# Altium integrated library Integrated_Library - 02.02.25 - 22.49.IntLib: 792 symbols (part 8 of 11)
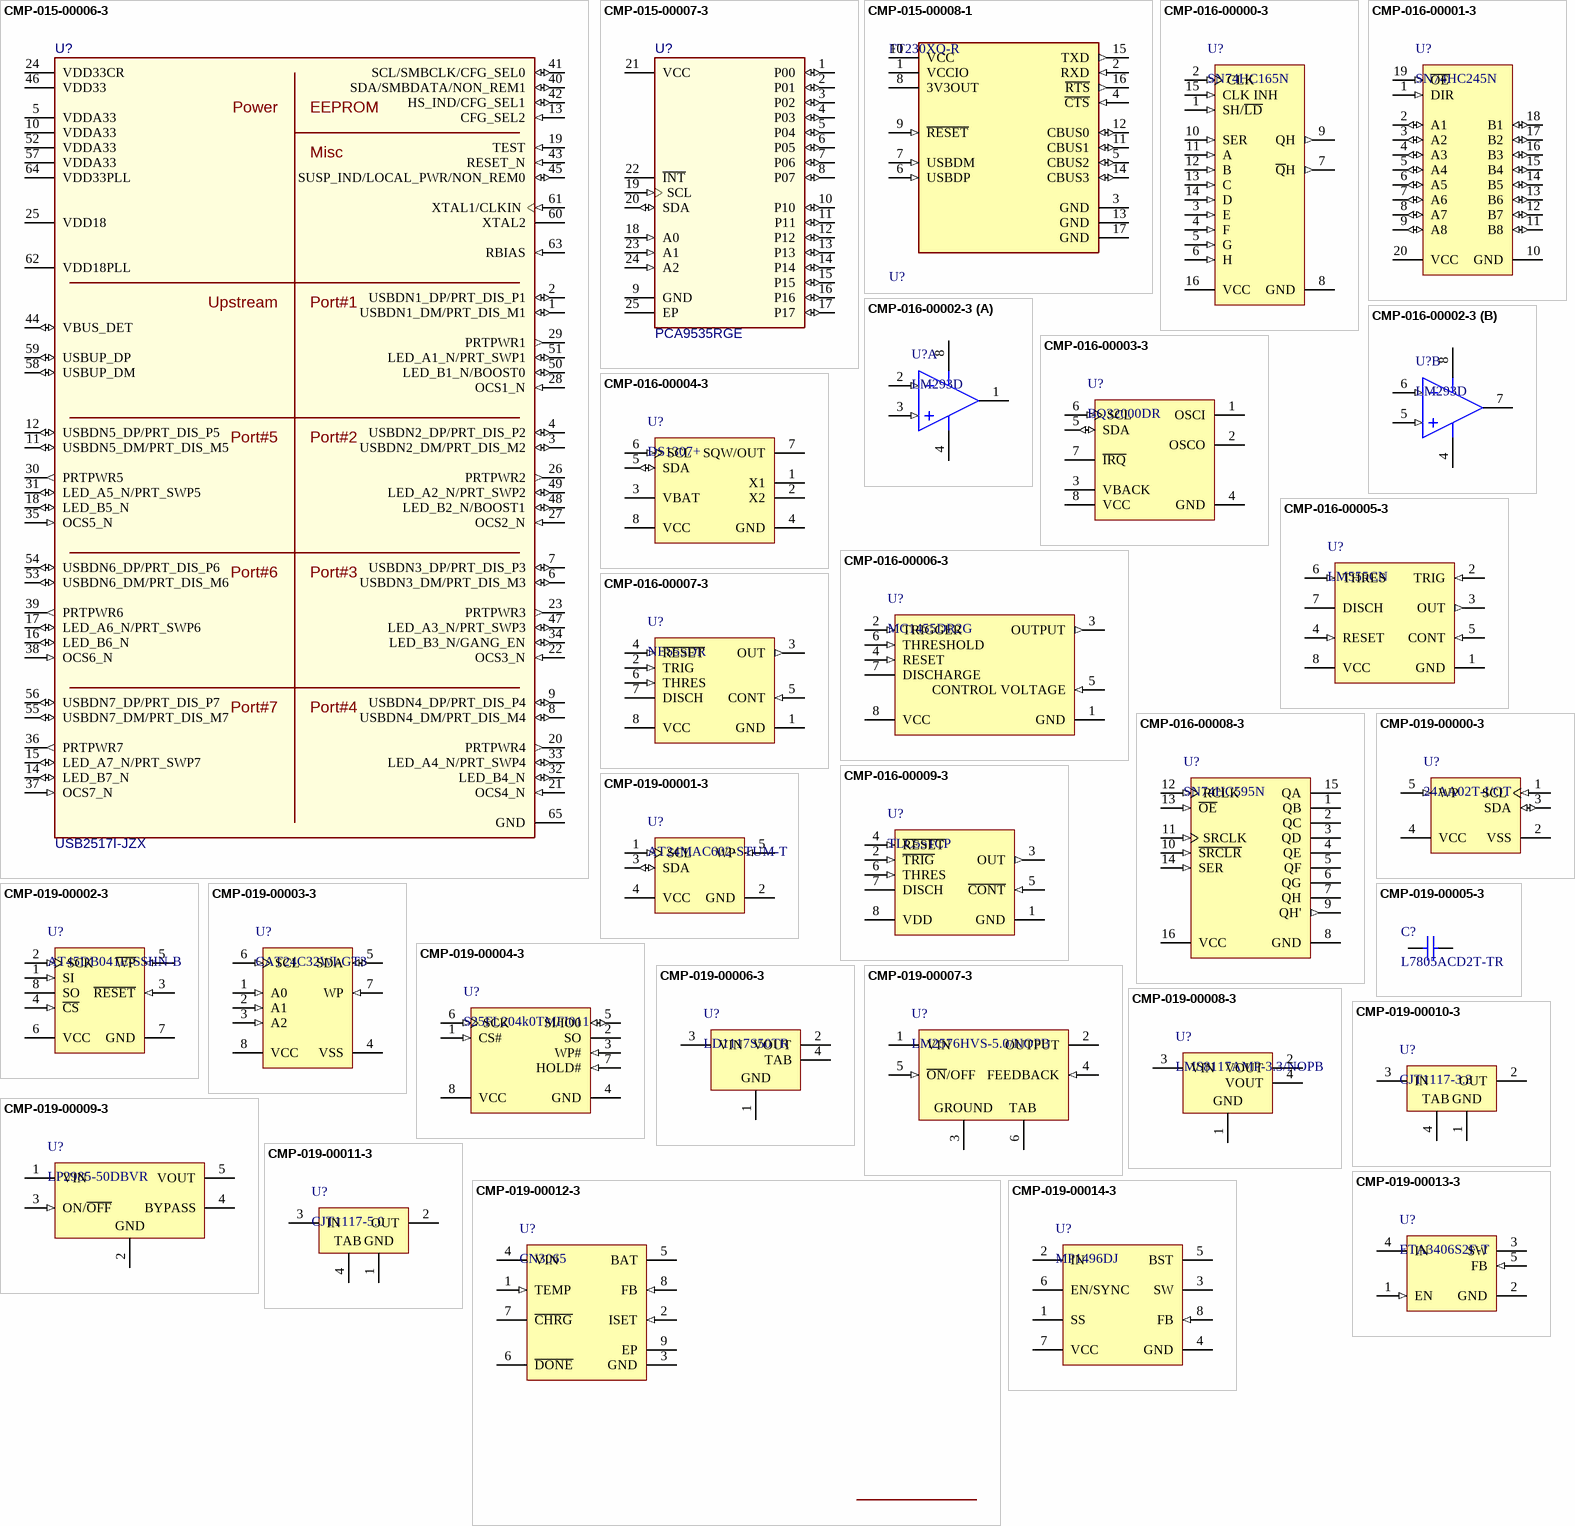
[diagram p33: symbols CMP-015-00006-3 to CMP-019-00014-3]

## CMP-015-00006-3
designator U?, comment USB2517I-JZX
Industrial Temperature Rated USB 2.0 Hi-Speed 7-Port Hub Controller, 3.3 V, -40 to 85 degC, 64-Pin QFN, RoHS, Tube; Case/Package: 64-VFQFNExposedPad; Pins: 65; Mounting Technology: SurfaceMount
footprint MCHP-QFN-64-4700X4700TP (QFN, 64-Leads, Body 9.1x9.1mm, Pitch 0.5mm, Thermal Pad 4.7x4.7mm)
footprint MCHP-QFN-64-4700X4700TP (QFN, 64-Leads, Body 9.1x9.1mm, Pitch 0.5mm, Thermal Pad 4.7x4.7mm)
pins: 1 USBDN1_DM/PRT_DIS_M1 (io), 2 USBDN1_DP/PRT_DIS_P1 (io), 3 USBDN2_DM/PRT_DIS_M2 (io), 4 USBDN2_DP/PRT_DIS_P2 (io), 5 VDDA33 (power) ""VDD Analog I/O.+3.3V Filtered analog PHY power which is shared between", 6 USBDN3_DM/PRT_DIS_M3 (io), 7 USBDN3_DP/PRT_DIS_P3 (io), 8 USBDN4_DM/PRT_DIS_M4 (io), 9 USBDN4_DP/PRT_DIS_P4 (io), 10 VDDA33 (power) ""VDD Analog I/O.+3.3V Filtered analog PHY power which is shared between", 11 USBDN5_DM/PRT_DIS_M5 (io), 12 USBDN5_DP/PRT_DIS_P5 (io), 13 CFG_SEL2 (in) "Configuration Programming Select", 14 LED_B7_N (io) "Enhanced Indicator LED for ports 7", 15 LED_A7_N/PRT_SWP7 (io), 16 LED_B6_N (io) "Enhanced Indicator LED for ports 6", 17 LED_A6_N/PRT_SWP6 (io), 18 LED_B5_N (io) "Enhanced Indicator LED for ports 5", 19 TEST (in) "TEST pin", 20 PRTPWR4 (out) "USB Power Enable", 21 OCS4_N (in) "Over-current Sense", 22 OCS3_N (in) "Over-current Sense", 23 PRTPWR3 (out) "USB Power Enable", 24 VDD33CR (power) ""VDDIO/VDD 3.3 Core Regulator Reference.+3.3V power supply for the Digital I/O. If the internal core", 25 VDD18 (power) ""VDD Core.+1.8V core power. This pin must have a 1.0uF (or greater) +/-20%", 26 PRTPWR2 (out) "USB Power Enable", 27 OCS2_N (in) "Over-current Sense", 28 OCS1_N (in) "Over-current Sense", 29 PRTPWR1 (out) "USB Power Enable", 30 PRTPWR5 (out) "USB Power Enable", 31 LED_A5_N/PRT_SWP5 (io), 32 LED_B4_N (io) "Enhanced Indicator LED for ports 4", 33 LED_A4_N/PRT_SWP4 (io), 34 LED_B3_N/GANG_EN (io), 35 OCS5_N (in) "Over-current Sense", 36 PRTPWR7 (out) "USB Power Enable", 37 OCS7_N (in) "Over-current Sense", 38 OCS6_N (in) "Over-current Sense", 39 PRTPWR6 (out) "USB Power Enable", 40 SDA/SMBDATA/NON_REM1 (io), 41 SCL/SMBCLK/CFG_SEL0 (io), 42 HS_IND/CFG_SEL1 (io), 43 RESET_N (in) "RESET Input", 44 VBUS_DET (io) "Detect Upstream VBUS Power", 45 SUSP_IND/LOCAL_PWR/NON_REM0 (io), 46 VDD33 (power) "VDD I/O.+3.3V Digital I/O power", 47 LED_A3_N/PRT_SWP3 (io), 48 LED_B2_N/BOOST1 (io), 49 LED_A2_N/PRT_SWP2 (io), 50 LED_B1_N/BOOST0 (io), 51 LED_A1_N/PRT_SWP1 (io), 52 VDDA33 (power) ""VDD Analog I/O.+3.3V Filtered analog PHY power which is shared between", 53 USBDN6_DM/PRT_DIS_M6 (io), 54 USBDN6_DP/PRT_DIS_P6 (io), 55 USBDN7_DM/PRT_DIS_M7 (io), 56 USBDN7_DP/PRT_DIS_P7 (io), 57 VDDA33 (power) ""VDD Analog I/O.+3.3V Filtered analog PHY power which is shared between", 58 USBUP_DM (io) "USB Bus Data", 59 USBUP_DP (io) "USB Bus Data", 60 XTAL2 "Crystal Output", 61 XTAL1/CLKIN (in) "Crystal Input/External Clock Input", 62 VDD18PLL (power) ""VDD PLL.+1.8V Filtered analog power for internal PLL. This pin must have", 63 RBIAS (in) "USB Transceiver Bias", 64 VDD33PLL (power) "VDD 3.3 PLL Regulator Reference.+3.3V power supply for the Digital I/O. If the internal PLL 1.8V regulator is enabled, then this pin acts as the regulator input.", 65 GND (power) "Ground"
text: Power; EEPROM; Misc; Upstream; Port#1; Port#5; Port#2; Port#6; Port#3; Port#7; Port#4

## CMP-015-00007-3
designator U?, comment PCA9535RGE
Remote 16-Bit I2C and SMBus I/O Expander with Interrupt Output and Configuration Registers, 2.3 to 5.5 V, -40 to 85 degC, 24-pin VQFN (RGE), Green (RoHS & no Sb/Br); Pins: 25; ComponentLink1Description: Datasheet; ComponentLink2Description: Package Specification; Mounting Technology: Surface Mount; ComponentLink2URL: http://www.ti.com/litv/pdf/mpds211a; ComponentLink1URL: http://www.ti.com/general/docs/lit/getliterature.tsp?genericPartNumber=PCA9535&fileType=pdf
footprint RGE0024C (QFN, 24-Leads, Body 4x4mm, Pitch 0.5mm, Thermal Pad 2.1x2.1mm)
footprint RGE0024C (QFN, 24-Leads, Body 4x4mm, Pitch 0.5mm, Thermal Pad 2.1x2.1mm)
pins: 1 P00 (io) "P-port input/output. Push-pull design structure.", 2 P01 (io) "P-port input/output. Push-pull design structure.", 3 P02 (io) "P-port input/output. Push-pull design structure.", 4 P03 (io) "P-port input/output. Push-pull design structure.", 5 P04 (io) "P-port input/output. Push-pull design structure.", 6 P05 (io) "P-port input/output. Push-pull design structure.", 7 P06 (io) "P-port input/output. Push-pull design structure.", 8 P07 (io) "P-port input/output. Push-pull design structure.", 9 GND (power) "Ground", 10 P10 (io) "P-port input/output. Push-pull design structure.", 11 P11 (io) "P-port input/output. Push-pull design structure.", 12 P12 (io) "P-port input/output. Push-pull design structure.", 13 P13 (io) "P-port input/output. Push-pull design structure.", 14 P14 (io) "P-port input/output. Push-pull design structure.", 15 P15 (io) "P-port input/output. Push-pull design structure.", 16 P16 (io) "P-port input/output. Push-pull design structure.", 17 P17 (io) "P-port input/output. Push-pull design structure.", 18 A0 (in) "Address input 0. Connect directly to VCC or ground.", 19 SCL (in) "Serial clock bus. Connect to VCC through a pullup resistor.", 20 SDA (io) "Serial data bus. Connect to VCC through a pullup resistor.", 21 VCC (power) "Supply voltage", 22 ~{INT} (oc) "Interrupt output. Connect to VCC through a pullup resistor.", 23 A1 (in) "Address input 1. Connect directly to VCC or ground.", 24 A2 (in) "Address input 2. Connect directly to VCC or ground.", 25 EP "Exposed thermal pad"

## CMP-015-00008-1
designator U?, comment FT230XQ-R
Microprocessor Circuit, CMOS, PQCC16; Min Supply Voltage: 2.97V; Nominal Supply Voltage: 5V; Max Supply Voltage: 5.5V; Height - Seated (Max): 0.9mm; Max Operating Temperature: 85°C; Case/Package: HVQCCN; Min Operating Temperature: -40°C; Pins: 16; JESD-30 Code: S-PQCC-N16; Length: 4mm; RoHS Compliant: Yes; JESD-609 Code: e3
footprint FP-QFN-16-IPC_B
footprint FP-QFN-16-IPC_C
footprint FP-QFN-16-IPC_A
footprint FP-QFN-16-MFG
pins: 1 VCCIO (power), 2 RXD (in), 3 GND (power), 4 ~{CTS} (in), 5 CBUS2 (io), 6 USBDP (in), 7 USBDM (in), 8 3V3OUT (power), 9 ~{RESET} (in), 10 VCC (power), 11 CBUS1 (io), 12 CBUS0 (io), 13 GND (power), 14 CBUS3 (io), 15 TXD (out), 16 ~{RTS} (out), 17 GND (power)

## CMP-016-00000-3
designator U?, comment SN74HC165N
Parallel-Load Shift Register, 8-Bit, 2 to 6 V, -40 to 125 degC, 16-Pin PDIP (N), Pb-Free (RoHS), Rail/Tube; Manufacturer: Texas Instruments; Nominal Supply Voltage: 5V; Elements: 1; Propagation Delay: 150ns; Direction: Unidirectional; Min Supply Voltage: 2V; Max Supply Voltage: 6V; Package Version: 4040049/E, 12/2002; Max Ouput Current: 5.2mA; Datasheet URL: http://www.ti.com/lit/ds/symlink/sn74hc165.pdf; Logic Function: ShiftRegister; Package Reference: PDIP-16; Pins: 16; Package Description: 16-Pin Plastic Double In-line Package, Body 19.305 x 6.35 mm, Pitch 2.54 mm; Manufacturer URL: http://www.ti.com/; Min Operating Temperature: -40°C; Packaging: Rail/Tube; Datasheet Version: SCLS116H, 12/2015; Package Quantity: 25; Package URL: http://www.ti.com/lit/ml/mpdi002c/mpdi002c.pdf; RoHS Compliant: True; Mounting Technology: TH; Case/Package: PDIP; Output Current: 5.2mA; Max Operating Temperature: 85°C
footprint TI-N0016A (DIP, 16-Leads, Body 19.7x6.6mm, Pitch 2.54mm)
pins: 1 SH/~{LD} (in), 2 CLK (in), 3 E (in), 4 F (in), 5 G (in), 6 H (in), 7 ~{Q}H (out), 8 GND (power), 9 QH (out), 10 SER (in), 11 A (in), 12 B (in), 13 C (in), 14 D (in), 15 CLK INH (in), 16 VCC (power)

## CMP-016-00001-3
designator U?, comment SN74HC245N
Octal Bus Transceiver, 2 to 6 V, -40 to 85 degC, 20-Pin PDIP (N), Pb-Free (RoHS), Tape and Reel; Manufacturer: Texas Instruments; Max Ouput Current: -7.8mA; Output Current: 7.8mA; Min Supply Voltage: 2V; Propagation Delay: 22ns; Elements: 1; Direction: Bidirectional; Channels: 8; Nominal Supply Voltage: 5V; Max Supply Voltage: 6V; Package Description: 20-Pin Double In-line Package, Body 25.4 x 6.35 mm, Pitch 2.54 mm; Mounting Technology: TH; Min Operating Temperature: -40°C; Packaging: Rail/Tube; Case/Package: DIP; Datasheet Version: SCLS131E, 09/2015; Package Quantity: 20; Package URL: http://www.ti.com/lit/ml/mpdi002c/mpdi002c.pdf; Datasheet URL: http://www.ti.com/lit/ds/symlink/sn74hc245.pdf; Max Operating Temperature: 85°C; Manufacturer URL: http://www.ti.com/; Package Reference: N0020A; RoHS Compliant: True; Pins: 20
footprint N0020A (DIP, 20-Leads, Body 26.9x6.6mm, Pitch 2.54mm)
pins: 1 DIR (in) "Direction Pin", 2 A1 (io) "A1 Input/Output", 3 A2 (io) "A2 Input/Output", 4 A3 (io) "A3 Input/Output", 5 A4 (io) "A4 Input/Output", 6 A5 (io) "A5 Input/Output", 7 A6 (io) "A6 Input/Output", 8 A7 (io) "A7 Input/Output", 9 A8 (io) "A8 Input/Output", 10 GND (power) "Ground Pin", 11 B8 (io) "B8 Input/Output", 12 B7 (io) "B7 Input/Output", 13 B6 (io) "B6 Input/Output", 14 B5 (io) "B5 Input/Output", 15 B4 (io) "B4 Input/Output", 16 B3 (io) "B3 Input/Output", 17 B2 (io) "B2 Input/Output", 18 B1 (io) "B1 Input/Output", 19 ~{OE} (in) "Output Enable", 20 VCC (power) "Power Pin"

## CMP-016-00002-3
designator U?, comment LM293D
Dual Differential Comparator, 2 to 30 V, -25 to 85 degC, 8-Pin SOIC (D), Green (RoHS & no Sb/Br), Tube; Manufacturer: Texas Instruments; Min Dual Supply Voltage: 1V; Nominal Voltage Gain: 106.02dB; Elements: 2; Nominal Supply Current: 500µA; Nominal Dual Supply Voltage: 12V; Max Supply Voltage: 30V; Nominal Supply Voltage: 3V; Max Dual Supply Voltage: 18V; Package Version: 4040047-3/M, 06/2011; Min Supply Voltage: 2V; Max Operating Temperature: 85°C; Packaging: Rail/Tube; Case/Package: SOIC; Mounting Technology: SM; Package URL: http://www.ti.com/lit/ml/msoi002j/msoi002j.pdf; Min Operating Temperature: -25°C; RoHS Compliant: True; Package Quantity: 75; Datasheet Version: SLCS005Y, 06/2015; Package Reference: D0008A; Pins: 8; Package Description: 8-Pin Small Outline Integrated Circuit, Body 4.9 x 3.9 mm, Pitch 1.27 mm; Manufacturer URL: http://www.ti.com/; Channels: 2; Datasheet URL: http://www.ti.com/general/docs/lit/getliterature.tsp?genericPartNumber=LM293&fileType=pdf
footprint D0008A_M (SOIC, 8-Leads, Body 5x4mm, Pitch 1.27mm, IPC Low Density)
footprint D0008A_N (SOIC, 8-Leads, Body 5x4mm, Pitch 1.27mm, IPC Medium Density)
footprint D0008A_L (SOIC, 8-Leads, Body 5x4mm, Pitch 1.27mm, IPC High Density)
pins on every part: 4 GND (power) "Ground", 8 VCC (power) "Supply Pin"
part A pins: 1 OUT1 (hiz) "Output pin of comparator 1", 2 IN1- (in) "Negative input pin of comparator 1", 3 IN1+ (in) "Positive input pin of comparator 1"
part B pins: 5 IN2+ (in) "Positive input pin of comparator 2", 6 IN2- (in) "Negative input pin of comparator 2", 7 OUT2 (hiz) "Output pin of comparator 2"

## CMP-016-00003-3
designator U?, comment BQ32000DR
Real-Time Clock (RTC), 3 to 3.6 V, -40 to 85 degC, 8-Pin SOIC (D), Green (RoHS & no Sb/Br), Tape and Reel; Manufacturer: Texas Instruments; Package Version: 4040047-3/M, 06/2011; Max Supply Voltage: 3.6V; Nominal Supply Voltage: 3.3V; Interface: Serial; Min Supply Voltage: 3V; RoHS Compliant: True; Datasheet Version: SLUS900E, 08/2015; Pins: 8; Mounting Technology: SM; Manufacturer URL: http://www.ti.com/; Package Description: 8-Pin Small Outline Integrated Circuit, Body 4.9 x 3.9 mm, Pitch 1.27 mm; Package Quantity: 2500; Datasheet URL: http://www.ti.com/lit/ds/symlink/bq32000.pdf; Package Reference: D0008A; Package URL: http://www.ti.com/lit/ml/msoi002j/msoi002j.pdf; Case/Package: SOIC; Max Operating Temperature: 85°C; Packaging: TapeandReel; Min Operating Temperature: -40°C
footprint D0008A_M (SOIC, 8-Leads, Body 5x4mm, Pitch 1.27mm, IPC Low Density)
footprint D0008A_N (SOIC, 8-Leads, Body 5x4mm, Pitch 1.27mm, IPC Medium Density)
footprint D0008A_L (SOIC, 8-Leads, Body 5x4mm, Pitch 1.27mm, IPC High Density)
pins: 1 OSCI "Oscillator input", 2 OSCO "Oscillator output", 3 VBACK (power) "Backup device power", 4 GND (power) "Ground", 5 SDA (io) "I2C serial data", 6 SCL (in) "I2C serial interface clock", 7 ~{IRQ} (oc) "Configurable interrupt output. Open-drain output.", 8 VCC (power) "Main device power"

## CMP-016-00004-3
designator U?, comment DS1307+
I2C Real-Time Clock, 5 V, 0 to 70 degC, 8-Pin DIP, RoHS, Tube; Manufacturer: Maxim; Min Supply Voltage: 4.5V; Interface: Serial; Nominal Supply Voltage: 5V; Package Version: Rev. E, 04/2011; Max Supply Voltage: 5.5V; RoHS Compliant: True; Manufacturer URL: http://www.maximintegrated.com/; Datasheet Version: Rev. 100208, 10/2008; Datasheet URL: https://datasheet.ciiva.com/20167/82-0567-20167410.pdf; Mounting Technology: TH; Package Quantity: 50; Packaging: Rail/Tube; Package Description: 8-Pin Plastic Dual-In-Line, Narrow (0.3in) (P8-1), Body 9.375 x 6.985 mm, Pitch 2.54 mm; Case/Package: DIP; Min Operating Temperature: 0°C; Package URL: http://pdfserv.maximintegrated.com/package_dwgs/21-0043.PDF; Pins: 8; Max Operating Temperature: 70°C; Package Reference: P8-1
footprint MAXM-P8-1 (DIP, 8-Leads, Body 9.375x6.985mm, Pitch 2.54mm)
pins: 1 X1 "Connections for Standard 32.768kHz Quartz Crystal.", 2 X2 "Connections for Standard 32.768kHz Quartz Crystal.", 3 VBAT (power) "Backup Supply Input for Any Standard 3V Lithium Cell or Other Energy Source.", 4 GND (power) "Ground", 5 SDA (io) "Serial Data Input/Output.", 6 SCL (in) "Serial Clock Input.", 7 SQW/OUT (oc) "Square Wave/Output Driver.", 8 VCC (power) "Primary Power Supply."

## CMP-016-00005-3
designator U?, comment LM555CN
Single Timer, 4.5 to 16 V, 0 to 70 degC, 8-Pin MDIP, RoHS, Rail; Manufacturer: Fairchild Semiconductor; Max Ouput Current: -200mA; Channels: 1; Max Supply Voltage: 16V; Nominal Supply Voltage: 5V; Nominal Supply Current: 7.5mA; Min Supply Voltage: 4.5V; Power: 600mW; Datasheet Version: Rev. 1.1.0, 01/2013; Case/Package: DIP; Max Operating Temperature: 70°C; RoHS Compliant: True; Min Operating Temperature: 0°C; Manufacturer URL: https://www.fairchildsemi.com/; Package Reference: MDIP 8L; Datasheet URL: https://www.fairchildsemi.com/datasheets/LM/LM555.pdf; Pins: 8; Package URL: https://www.fairchildsemi.com/package-drawings/N0/N08E.pdf; Package Description: 8-Pin Dual Inline Package, Body 9.815 x 6.35 mm, Pitch 2.54 mm; Package Quantity: 50; Packaging: Rail/Tube; Mounting Technology: TH
footprint FAIR-MDIP 8L (DIP, 8-Leads, Body 9.4x6.6mm, Pitch 2.54mm)
pins: 1 GND (power), 2 TRIG (in), 3 OUT (out), 4 RESET (in), 5 CONT (in), 6 THRES (in), 7 DISCH (oc), 8 VCC (power)

## CMP-016-00006-3
designator U?, comment MC1455DR2G
Timer, 4.5 to 16 V, 625 mW, 0 to 70 degC, 8-Pin SOIC (751-07), Pb-Free, Tape and Reel; Manufacturer: ON Semiconductor; Max Supply Voltage: 16V; Nominal Supply Current: 10mA; Max Ouput Current: 200mA; Min Supply Voltage: 4.5V; Power: 625mW; Packaging: TapeandReel; Min Operating Temperature: 0°C; RoHS Compliant: True; Pins: 8; Datasheet Version: Rev. 10, 12/2009; Package Quantity: 2500; Datasheet URL: http://www.onsemi.cn/pub_link/Collateral/MC1455-D.PDF; Package URL: http://www.onsemi.com/pub_link/Collateral/NB2304A-D.PDF; Manufacturer URL: http://www.onsemi.com/; Package Reference: SOIC-8-751-07_AJ; Case/Package: SOIC; Package Description: 8-Pin Small Outline Integrated Circuit, Body 4.9 x 3.9 mm, Pitch 1.27 mm; Max Operating Temperature: 70°C; Mounting Technology: SM
footprint ONSC-SOIC-8-751-07_AJ_V (SOIC, 8-Leads, Body 5x4mm, Pitch 1.27mm)
pins: 1 GND (power), 2 TRIGGER (in), 3 OUTPUT (out), 4 RESET (in), 5 CONTROL VOLTAGE (in), 6 THRESHOLD (in), 7 DISCHARGE, 8 VCC (power)

## CMP-016-00007-3
designator U?, comment NE555DR
Precision Timer, 4.5 to 16 V, 0 to 70 degC, 8-Pin SOIC (D), Green (RoHS & no Sb/Br), Tape and Reel; Manufacturer: Texas Instruments; Max Ouput Current: -200mA; Frequency: 100kHz; Max Supply Voltage: 16V; Min Supply Voltage: 4.5V; Package Version: 4040047-3/M, 06/2011; Datasheet Version: SLFS022I, 09/2014; Datasheet URL: http://www.ti.com/general/docs/lit/getliterature.tsp?genericPartNumber=NE555&fileType=pdf; Package Reference: D0008A; Min Operating Temperature: 0°C; Case/Package: SOIC; Pins: 8; RoHS Compliant: True; Packaging: TapeandReel; Package Quantity: 2500; Package URL: http://www.ti.com/lit/ml/msoi002j/msoi002j.pdf; Package Description: 8-Pin Small Outline Integrated Circuit, Body 4.9 x 3.9 mm, Pitch 1.27 mm; Mounting Technology: SM; Max Operating Temperature: 70°C; Manufacturer URL: http://www.ti.com/
footprint D0008A_M (SOIC, 8-Leads, Body 5x4mm, Pitch 1.27mm, IPC Low Density)
footprint D0008A_N (SOIC, 8-Leads, Body 5x4mm, Pitch 1.27mm, IPC Medium Density)
footprint D0008A_L (SOIC, 8-Leads, Body 5x4mm, Pitch 1.27mm, IPC High Density)
pins: 1 GND (power), 2 TRIG (in), 3 OUT (out), 4 ~{RESET} (in), 5 CONT (in), 6 THRES (in), 7 DISCH (oc), 8 VCC (power)

## CMP-016-00008-3
designator U?, comment SN74HC595N
Shift Register, 8-Bit, 2 to 6 V, -40 to 85 degC, 16-Pin PDIP (N), Pb-Free (RoHS), Tube; Manufacturer: Texas Instruments; Propagation Delay: 200ns; Max Ouput Current: 7.8mA; Nominal Supply Voltage: 5V; Max Supply Voltage: 6V; Min Supply Voltage: 2V; Elements: 1; Direction: Unidirectional; Max Operating Temperature: 85°C; Packaging: Rail/Tube; Case/Package: PDIP; Package Quantity: 25; Logic Function: ShiftRegister; RoHS Compliant: True; Min Operating Temperature: -40°C; Datasheet Version: Rev. I, 09/2015; Datasheet URL: http://www.ti.com/lit/ds/symlink/sn74hc595.pdf; Pins: 16; Manufacturer URL: http://www.ti.com/
footprint N0016A (DIP, 16-Leads, Body 19.7x6.6mm, Pitch 2.54mm)
pins: 1 QB (hiz) "QB Output", 2 QC (hiz) "QC Output", 3 QD (hiz) "QD Output", 4 QE (hiz) "QE Output", 5 QF (hiz) "QF Output", 6 QG (hiz) "QG Output", 7 QH (hiz) "QH Output", 8 GND (power) "Ground Pin", 9 QH' (out) "QH' Output", 10 ~{SRCLR} (in) "S\R\C\L\R\ Input", 11 SRCLK (in) "SRCLK Input", 12 RCLK (in) "RCLK Input", 13 ~{OE} (in) "Output Enable Pin", 14 SER (in) "SER Input", 15 QA (hiz) "QA Output", 16 VCC (power) "Power Pin"

## CMP-016-00009-3
designator U?, comment TLC551CP
LinCMOS(TM) Timer, 1.8 MHz, 1 to 15 V, 0 to 70 degC, 8-Pin PDIP (P), Green (RoHS & no Sb/Br), Tube; Manufacturer: Texas Instruments; Nominal Supply Current: 170µA; Package Version: 4040082/E, 04/2010; Max Ouput Current: -10mA; Min Supply Voltage: 1V; Channels: 1; Frequency: 1.8MHz; Max Supply Voltage: 15V; Power: 1W; Pins: 8; RoHS Compliant: True; Packaging: Rail/Tube; Package Reference: P0008A; Datasheet Version: SLFS044B, 09/1997; Package Quantity: 50; Package URL: http://www.ti.com/lit/ml/mpdi001b/mpdi001b.pdf; Case/Package: DIP; Mounting Technology: TH; Max Operating Temperature: 70°C; Package Description: 8-Pin Double In-line Package, Body 9.59 x 6.35 mm, Pitch 2.54 mm; Manufacturer URL: http://www.ti.com/; Datasheet URL: http://www.ti.com/lit/ds/symlink/tlc551.pdf; Min Operating Temperature: 0°C
footprint P0008A (DIP, 8-Leads, Body 10.15x6.6mm, Pitch 2.54mm)
pins: 1 GND (power), 2 ~{TRIG} (in), 3 OUT (out), 4 ~{RESET} (in), 5 ~{CONT} (in), 6 THRES (in), 7 DISCH, 8 VDD (power)

## CMP-019-00000-3
designator U?, comment 24AA02T-I/OT
I2C Serial EEPROM, 2 Kbit, 1.7 V, -40 to 85 degC, 5-Pin SOT-23, RoHS, Tape and Reel; Manufacturer: Microchip; Access Time: 900ns; Clock Frequency: 400kHz; Density: 2Kb; Max Supply Voltage: 5.5V; Nominal Supply Current: 3mA; Min Supply Voltage: 1.8V; Mounting Technology: SM; Max Operating Temperature: 85°C; Package Description: 5-Pin Small Outline Transistor, Body 2.9 x 1.55 mm, Pitch 0.95 mm; Interface: I2C; Datasheet Version: Rev. J, 02/2009; Packaging: TapeandReel; RoHS Compliant: True; Min Operating Temperature: -40°C; Package Quantity: 3000; Max Clock Frequency: 400KHz; Pins: 5; Datasheet URL: http://ww1.microchip.com/downloads/en/DeviceDoc/21709J.pdf; Frequency: 400kHz; Case/Package: SOT-23-5; Package Reference: SOT23-5; Manufacturer URL: http://www.microchip.com/; Package URL: http://www.microchip.com/stellent/groups/techpub_sg/documents/packagingspec/en012702.pdf
footprint MCHP-SOT23-5_L (SOT23, 5-Leads, Body 3.10x1.80mm, Pitch 0.95mm, IPC High Density)
footprint MCHP-SOT23-5_N (SOT23, 5-Leads, Body 3.10x1.80mm, Pitch 0.95mm, IPC Medium Density)
footprint MCHP-SOT23-5_M (SOT23, 5-Leads, Body 3.10x1.80mm, Pitch 0.95mm, IPC Low Density)
pins: 1 SCL (in), 2 VSS (power), 3 SDA (io), 4 VCC (power), 5 WP (in)

## CMP-019-00001-3
designator U?, comment AT24MAC602-STUM-T
2-wire Serial EEPROM with a Factory-Programmed EUI-64(TM)Address Plus an Embedded Unique 128-bit Serial Number, 2 Kbit, 1.7 to 5.5 V, -40 to 85 degC, 5-Pin SOT23 (5TS1), Tape and Reel; Manufacturer: Atmel; Nominal Supply Current: 3mA; Access Time: 550ns; Min Supply Voltage: 1.7V; Max Clock Frequency: 1MHz; Density: 2Kb; Max Supply Voltage: 5.5V; Package Description: 5-Pin Plastic Thin Shrink Small Outline Package, Body 2.9 x 1.6 mm, Pitch 0.95 mm; Package Quantity: 5000; Datasheet URL: http://www.atmel.com/Images/Atmel-8807-SEEPROM-AT24MAC402-602-Datasheet.pdf; Max Operating Temperature: 85°C; Case/Package: SOT-23-5; RoHS Compliant: True; Datasheet Version: Rev. 8808E, 01/2015; Interface: Serial; Frequency: 1MHz; Packaging: TapeandReel; Mounting Technology: SM; Package Reference: 5TS1; Manufacturer URL: http://www.atmel.com/; Min Operating Temperature: -40°C; Pins: 5
footprint ATML-5TS1_L (SOT23, 5-Leads, Body 2.9x1.6mm, Pitch 0.95mm, IPC High Density)
footprint ATML-5TS1_M (SOT23, 5-Leads, Body 2.9x1.6mm, Pitch 0.95mm, IPC Low Density)
footprint ATML-5TS1_N (SOT23, 5-Leads, Body 2.9x1.6mm, Pitch 0.95mm, IPC Medium Density)
pins: 1 SCL (in) "Serial Clock Input", 2 GND (power) "Ground", 3 SDA (io) "Serial Data", 4 VCC (power) "Power Supply", 5 WP (in) "Write Protect"

## CMP-019-00002-3
designator U?, comment AT45DB041E-SSHN-B
SPI Serial Flash Memory, 4-Mbit, 1.65 to 3.6 V, -40 to 85 degC, 8-Pin SOIC (8S1), RoHS, Tube; Manufacturer: Adesto; Max Clock Frequency: 70MHz; Access Time: 7ns; Nominal Supply Current: 15mA; Page Size: 264B; Nominal Supply Voltage: 1.8V; Word Size: 8b; Max Supply Voltage: 3.6V; Density: 4Mb; Clock Frequency: 85MHz; Min Supply Voltage: 1.65V; Pins: 8; RoHS Compliant: True; Package Description: 8-Pin Small Outline Integrated Circuit, Body 4.925 x 3.9 mm, Pitch 1.27 mm; Mounting Technology: SM; Manufacturer URL: http://www.adestotech.com/; Packaging: Rail/Tube; Package Reference: 8S1; Min Operating Temperature: -40°C; Max Operating Temperature: 85°C; Case/Package: SOIC; Package Quantity: 98; Datasheet URL: http://www.adestotech.com/wp-content/uploads/doc8783.pdf; Datasheet Version: Rev. 8783I, 03/2016; Interface: SPI
footprint ADST-8S1_N (SOIC, 8-Leads, Body 5.1x4mm, Pitch 1.27mm, IPC Medium Density)
footprint ADST-8S1_M (SOIC, 8-Leads, Body 5.1x4mm, Pitch 1.27mm, IPC Low Density)
footprint ADST-8S1_L (SOIC, 8-Leads, Body 5.1x4mm, Pitch 1.27mm, IPC High Density)
pins: 1 SI (in) "Serial Input: The SI pin is used to shift data into the device. The SI pin is used for all data input including command and address sequences. Data on the SI pin is always latched on the rising edge of SCK. Data present on (See Datasheet)", 2 SCK (in) "Serial Clock: This pin is used to provide a clock to the device and is used to control the flow of data to and from the device. Command, address, and input data present on the SI pin is always latched on the rising edge of (See Datasheet)", 3 ~{RESET} (in) "Reset: A low state on the reset pin (R\E\S\E\T\) will terminate the operation in progress and reset the internal state machine to an idle state. The device will remain in the reset condition as long as a low level is present (See Datasheet)", 4 ~{CS} (in) "Chip Select: Asserting the C\S\ pin selects the device. When the C\S\ pin is deasserted, the device will be deselected and normally be placed in the standby mode (not Deep Power-Down mode) and the output pin (SO) will be in (See Datasheet)", 5 ~{WP} (in) "Write Protect: When the W\P\ pin is asserted, all sectors specified for protection by the Sector Protection Register will be protected against program and erase operations regardless of whether the Enable Sector Protection (See Datasheet)", 6 VCC (power) "Device Power Supply: The VCC pin is used to supply the source voltage to the device. Operations at invalid VCC voltages may produce spurious results and should not be attempted.", 7 GND (power) "Ground: The ground reference for the power supply. GND should be connected to the system ground.", 8 SO (hiz) "Serial Output: The SO pin is used to shift data out from the device. Data on the SO pin is always clocked out on the falling edge of SCK. The SO pin will be in a high-impedance state whenever the device is deselected (C\S\ (See Datasheet)"

## CMP-019-00003-3
designator U?, comment CAT24C32WI-GT3
I2C CMOS Serial EEPROM, 32 Kb, 1.7 to 5.5 V, -40 to 85 degC, 8-Pin SOIC (751BD), RoHS, Tape and Reel; Manufacturer: ON Semiconductor; Nominal Supply Current: 2mA; Access Time: 3500ns; Clock Frequency: 100kHz; Density: 32Kb; Max Supply Voltage: 5.5V; Frequency: 400kHz; Min Supply Voltage: 1.7V; Package URL: http://www.onsemi.com/pub_link/Collateral/751BD.PDF; Max Operating Temperature: 85°C; Pins: 8; Min Operating Temperature: -40°C; Datasheet URL: http://www.onsemi.com/pub_link/Collateral/CAT24C32-D.PDF; Manufacturer URL: http://www.onsemi.com/; Interface: Serial; Datasheet Version: Rev. 24, 06/2015; RoHS Compliant: True; Max Clock Frequency: 100KHz; Mounting Technology: SM; Package Description: 8-Pin Small Outline Integrated Circuit, Body 4.9 x 3.9 mm, Pitch 1.27 mm; Case/Package: SOIC; Package Reference: SOIC-8-751BD-01; Packaging: TapeandReel; Package Quantity: 3000
footprint ONSC-SOIC-8-751BD-01_L (SOIC, 8-Leads, Body 5x4mm, Pitch 1.27mm, IPC High Density)
footprint ONSC-SOIC-8-751BD-01_N (SOIC, 8-Leads, Body 5x4mm, Pitch 1.27mm, IPC Medium Density)
footprint ONSC-SOIC-8-751BD-01_M (SOIC, 8-Leads, Body 5x4mm, Pitch 1.27mm, IPC Low Density)
pins: 1 A0 (in) "Device Address", 2 A1 (in) "Device Address", 3 A2 (in) "Device Address", 4 VSS (power) "Ground", 5 SDA (io) "Serial Data", 6 SCL (in) "Serial Clock", 7 WP (in) "Write Protect", 8 VCC (power) "Power Supply"

## CMP-019-00004-3
designator U?, comment S25FL204k0TMFI011
SPI Flash Memory, 2.7 to 3.6 V, -40 to 85 degC, 8-Pin SOIC (SOC 008), RoHS, Tube; Manufacturer: Cypress; Datasheet URL: http://www.cypress.com/file/196871/download; Package Reference: SOIC-8; Datasheet Version: Rev. *G , 09/2015; Package Description: 8-Pin Small Outline Integrated Circuit, Body 5.283 x 5.283 mm, Pitch 1.27 mm; RoHS Compliant: True; Mounting Technology: SM; Manufacturer URL: http://www.cypress.com/; Case/Package: SOIC-8
footprint CYP-SOC-8_L (SOIC, 8-Leads, Body 5.3x5.3mm, Pitch 1.27mm, IPC High Density)
footprint CYP-SOC-8_N (SOIC, 8-Leads, Body 5.3x5.3mm, Pitch 1.27mm, IPC Medium Density)
footprint CYP-SOC-8_M (SOIC, 8-Leads, Body 5.3x5.3mm, Pitch 1.27mm, IPC Low Density)
pins: 1 CS# (in) "Chip Enable", 2 SO (hiz) "Serial Data Output", 3 WP# (in) "Write Protect", 4 GND (power) "Ground", 5 SI/IO0 (io) "Serial Data Input / Output", 6 SCK (in) "Serial Clock Input", 7 HOLD# (in) "Hold Input", 8 VCC (power) "Supply Voltage (2.7-3.6V)"

## CMP-019-00005-3
designator C?, comment L7805ACD2T-TR
Positive Voltage Regulator IC, 5 V, 1.5 A, 0 to 125 degC, 3-Pin D2PAK, RoHS, Tape and Reel; Manufacturer: STMicroelectronics; Package Version: Rev. 1, 11/2014; Min Input Voltage: 7V; Max Ouput Current: 1A; Max Input Voltage: 35V; Output Current: 1.5A; Output Voltage: 5V; Dropout Voltage: 2V; Outputs: 1; Max Supply Voltage: 20V; Min Supply Voltage: 7.5V; Min Operating Temperature: 0°C; RoHS Compliant: True; Package Reference: D2PAK; Mounting Technology: SM; Packaging: TapeandReel; Case/Package: TO-263-3; Manufacturer URL: http://www.st.com/; Pins: 8; Max Operating Temperature: 125°C; Package URL: http://www.st.com/st-web-ui/static/active/en/resource/technical/document/datasheet/DM00122355.pdf; Datasheet URL: http://www.st.com/content/ccc/resource/technical/document/datasheet/41/4f/b3/b0/12/d4/47/88/CD00000444.pdf/files/CD00000444.pdf/jcr:content/translations/en.CD00000444.pdf; Package Quantity: 1000; Package Description: 3-Pin D2PAK, Body 10.2 x 9.15 mm, Pitch 2.54 mm; Datasheet Version: Rev. 34, 11/2016; Nominal Output Voltage: 5V
footprint STM-D2PAK_V (DPAK, 3-Leads, Body 10.2x9.15mm, Pitch 2.54mm)
pins: 1, 2

## CMP-019-00006-3
designator U?, comment LD1117S50TR
Fixed Low Drop Positive Voltage Regulator, 5 V, 0 to 125 degC, 4-Pin SOT223, RoHS, Tape and Reel; Manufacturer: STMicroelectronics; Max Input Voltage: 15V; Min Supply Voltage: 6.5V; Max Ouput Current: 1.3A; Output Voltage: 5V; Output Current: 950mA; Dropout Voltage: 1.1V; Power: 12W; Outputs: 1; Packaging: TapeandReel; Datasheet URL: http://www.st.com/content/ccc/resource/technical/document/datasheet/99/3b/7d/91/91/51/4b/be/CD00000544.pdf/files/CD00000544.pdf/jcr:content/translations/en.CD00000544.pdf; Package Reference: SOT-223; RoHS Compliant: True; Datasheet Version: Nov-13; Min Operating Temperature: 0°C; Case/Package: TO-261-4; Pins: 4; Manufacturer URL: http://www.st.com/; Mounting Technology: SM; Package Quantity: 2500; Nominal Output Voltage: 5V; Max Supply Voltage: 15V; Min Input Voltage: 6.5V; Max Operating Temperature: 125°C; Package Description: 4-Pin Small Outline Transistor, Body 6.5 x 3.5 mm, Pitch 2.3 mm
footprint STM-SOT-223_M (SOT223, 4-Leads, Body 6.7x3.7mm, Pitch 2.3mm, IPC Low Density)
footprint STM-SOT-223_L (SOT223, 4-Leads, Body 6.7x3.7mm, Pitch 2.3mm, IPC High Density)
footprint STM-SOT-223_N (SOT223, 4-Leads, Body 6.7x3.7mm, Pitch 2.3mm, IPC Medium Density)
pins: 1 GND (power), 2 VOUT (power), 3 VIN (power), 4 TAB (power)

## CMP-019-00007-3
designator U?, comment LM2576HVS-5.0/NOPB
SIMPLE SWITCHER(R) Step-Down Regulator, 5 V, 3 A, -40 to 125 degC, 5-Pin TO-263 (TKK), Pb-Free (RoHS Exempt), Tube; Manufacturer: Texas Instruments; Output Current: 3A; Max Supply Voltage: 60V; Efficiency: 77%; Frequency: 58kHz; Min Supply Voltage: 4V; Outputs: 1; Output Voltage: 5V; Mounting Technology: SM; Package Description: 5-Pin Surface Mount Device, Body 10.225 x 9.91 mm, Pitch 1.7 mm; Datasheet URL: http://www.ti.com/lit/ds/symlink/lm2576hv.pdf; Max Operating Temperature: 125°C; Min Operating Temperature: -40°C; Packaging: Rail/Tube; Case/Package: TO-263-5; Max Input Voltage: 60V; Max Ouput Current: 3A; Switching Frequency: 58KHz; Package Quantity: 45; Package Reference: KTT0005B; Min Input Voltage: 4V; Datasheet Version: SNVS107D, 05/2016; Pins: 5; Manufacturer URL: http://www.ti.com/; RoHS Compliant: True
footprint KTT0005B_N (DPAK, 5-Leads, Body 10.65x9.65mm, Pitch 1.7mm, IPC Medium Density)
footprint KTT0005B_L (DPAK, 5-Leads, Body 10.65x9.65mm, Pitch 1.7mm, IPC High Density)
footprint KTT0005B_M (DPAK, 5-Leads, Body 10.65x9.65mm, Pitch 1.7mm, IPC Low Density)
pins: 1 VIN (power) "Supply input pin to collector pin of high-side transistor. Connect to power supply and input bypass capacitors CIN. Path from VIN pin to high frequency bypass CIN and GND must be as short as possible.", 2 OUTPUT (power) "Emitter pin of the power transistor. This is a switching node. Attached this pin to an inductor and the cathode of the external diode.", 3 GROUND (power) "Ground pin. Path to CIN must be as short as possible.", 4 FEEDBACK (in) "Feedback sense input pin. Connect to the midpoint of feedback divider to set VOUT for ADJ version or connect this pin directly to the output capacitor for a fixed output version.", 5 ~{ON}/OFF (in) "Enable input to the voltage regulator. High = OFF and low = ON. Connect to GND to enable the voltage regulator. Do not leave this pin float.", 6 TAB (power) "Connected to GND. Put a copper plane connected to this pin as a thermal relief for DDPAK package."

## CMP-019-00008-3
designator U?, comment LMS8117AMP-3.3/NOPB
Low-Dropout Linear Regulator, 1 A, 3.3 V, 0 to 125 degC, 4-Pin SOT223 (DCY), RoHS, Tape and Reel; Manufacturer: Texas Instruments; Min Input Voltage: 2.5V; Min Supply Voltage: 3.2V; Max Supply Voltage: 15V; Outputs: 1; Output Current: 1A; Nominal Supply Current: 5mA; Dropout Voltage: 1.2V; Output Voltage: 3.3V; Datasheet URL: http://www.ti.com/lit/ds/symlink/lms8117a.pdf; Manufacturer URL: http://www.ti.com/; Package Reference: DCY0004A; Max Operating Temperature: 125°C; Datasheet Version: SNOS487F, 05/2004; Max Input Voltage: 15V; Mounting Technology: SM; Package Description: 4-Pin Small Outline Transistor, Body 6.5 x 3.5 mm, Pitch 2.3 mm; Pins: 4; Package Quantity: 1000; Packaging: TapeandReel; RoHS Compliant: True; Min Operating Temperature: 0°C; Case/Package: SOT-223; Max Ouput Current: 1A
footprint DCY0004A_M (SOT223, 4-Leads, Body 6.7x3.7mm, Pitch 2.3mm, IPC Low Density)
footprint DCY0004A_N (SOT223, 4-Leads, Body 6.7x3.7mm, Pitch 2.3mm, IPC Medium Density)
footprint DCY0004A_L (SOT223, 4-Leads, Body 6.5x3.5mm, Pitch 2.3mm, IPC High Density)
pins: 1 GND (power) "Ground pin for fixed output option.", 2 VOUT (power) "Output voltage pin for the regulator", 3 VIN (power) "Input voltage pin for the regulator", 4 VOUT (power) "Output voltage pin for the regulator"

## CMP-019-00009-3
designator U?, comment LP2985-50DBVR
Low-Noise Low-Dropout Regulator with Shutdown, 150 mA, Fixed 5 V Output, 2.2 to 16 V Input, 5-Pin SOT-23 (DBV), -40 to 125 degC, Green (RoHS & no Sb/Br), Tape and Reel; Manufacturer: Texas Instruments; Outputs: 1; Nominal Output Voltage: 5V; Min Input Voltage: 2.2V; Output Current: 150mA; Max Input Voltage: 16V; Dropout Voltage: 280mV; Manufacturer URL: http://www.ti.com/; Package Description: 5-Pin Small Outline Transistor, Body 2.9 x 1.6 mm, Pitch 0.95 mm; Min Operating Temperature: -40°C; Package URL: http://www.ti.com/lit/ml/mpds018l/mpds018l.pdf; Package Quantity: 1; Datasheet URL: http://www.ti.com/lit/ds/symlink/lp2985.pdf; Pins: 8; Datasheet Version: SLVS522O, 01/2015; Package Reference: DBV0005A; Case/Package: SOT-23-5; Max Operating Temperature: 125°C; Mounting Technology: SM; Output Voltage: 5V; RoHS Compliant: True; Max Ouput Current: 150mA; Packaging: TapeandReel
footprint DBV0005A_L (SOT23, 5-Leads, Body 3.05x1.75mm, Pitch 0.95mm, IPC High Density)
footprint DBV0005A_N (SOT23, 5-Leads, Body 3.05x1.75mm, Pitch 0.95mm, IPC Medium Density)
footprint DBV0005A_M (SOT23, 5-Leads, Body 3.05x1.75mm, Pitch 0.95mm, IPC Low Density)
pins: 1 VIN (power) "Input Voltage", 2 GND (power) "Common Ground (device substrate)", 3 ON/~{OFF} (in) "Logic high enable input", 4 BYPASS "Bypass capacitor for low noise operation", 5 VOUT (power) "Regulated output voltage"

## CMP-019-00010-3
designator U?, comment CJT1117-3.3
Low Dropout Linear Regulator, 1 A, 3.3 V, 0 to 125 degC, 4-Pin SOT223, RoHS, Tape and Reel; Manufacturer: Jiangsu Changjiang Electronics Technology; Package Description: 4-Pin Small Outline Transistor, Body 6.3 x 3.5 mm, Pitch 2.3 mm; Package URL: http://www.cj-elec.com/gallery/txUpfile/2013626129718915.pdf; Package Reference: SOT223-4; Datasheet URL: https://statics3.seeedstudio.com/images/opl/datasheet/1310190P1.pdf; Mounting Technology: SM; Datasheet Version: Rev. A, 01/2012; RoHS Compliant: Unknown; Case/Package: SOT223-4
footprint JSCJ-SOT223-4_M (SOT223, 4-Leads, Body 6.4x3.7mm, Pitch 2.3mm, IPC Low Density)
footprint JSCJ-SOT223-4_N (SOT223, 4-Leads, Body 6.4x3.7mm, Pitch 2.3mm, IPC Medium Density)
footprint JSCJ-SOT223-4_L (SOT223, 4-Leads, Body 6.4x3.7mm, Pitch 2.3mm, IPC High Density)
pins: 1 GND (power), 2 OUT (power), 3 IN (power), 4 TAB
